# Altium schematic symbol library SCHLIB.SchLib: 2608 symbols (part 1 of 20)
Pins are listed as number, name and electrical type; pins without a type are passive.

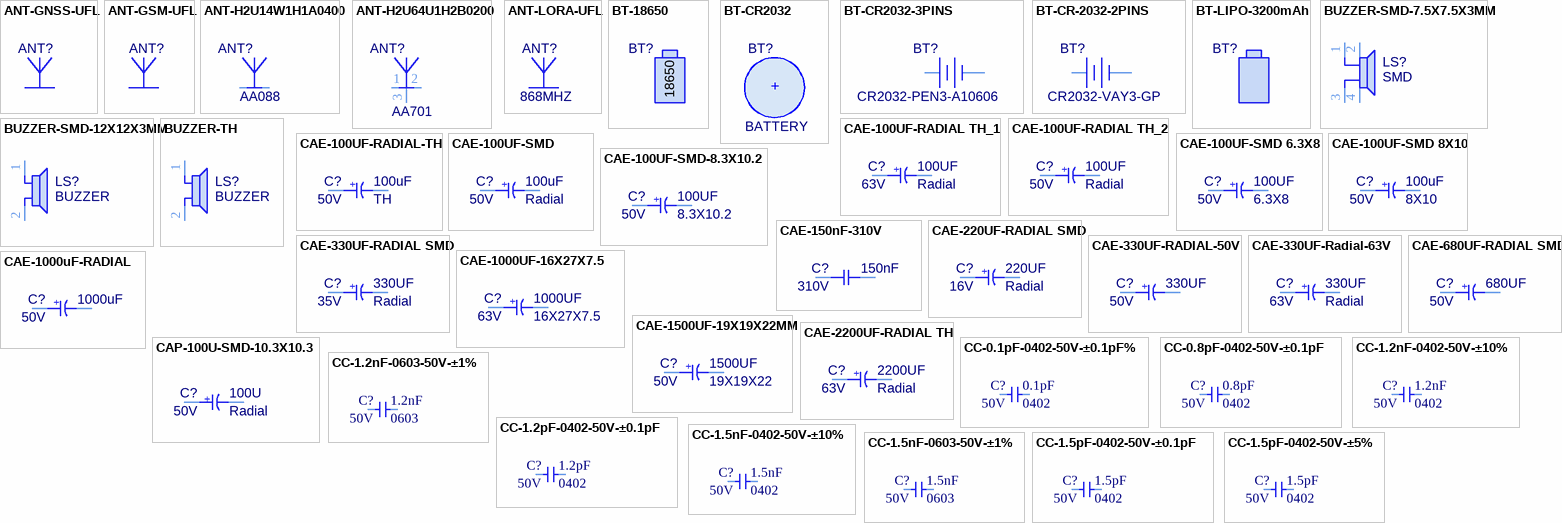
[diagram p0: symbols ANT-GNSS-UFL to CC-1.5pF-0402-50V-±5%]

## ANT-GNSS-UFL
designator ANT?, comment 206560-0050  (value not drawn)  (net tie)
RF ANT 1.561/1.575GHZ FLAT 50MM; Manufacturer: Molex; Number of Bands: 3; Return Loss: -8dB; Washability: OK; Supplier: Digi-Key; Manufacturer Part Number: 206560-0050; RoHS: No; Supplier Part Number: WM22046-ND; Stock: 0; Supplier 1: Digi-Key; Supplier Part Number 1: WM22046-ND; Pricing: 1=2.8, 10=2.517, 25=2.3744, 100=2.0229, 250=1.8994, 500=1.662, 1000=1.3771, 2500=1.2821, 5000=1.2346 (USD); Mount: Adhesive; Termination: Cable; ComponentLink1URL: https://www.molex.com/pdm_docs/sd/2065600100_sd.pdf?src-supplier=Digi-Key; ComponentLink1Description: https://www.molex.com/pdm_docs/sd/2065600100_sd.pdf?src-supplier=Digi-Key
footprint R-1206-ARRAY (SMD, 8-Leads, Body 1.6x3.2mm, Pitch 0.8mm)

## ANT-GSM-UFL
designator ANT?, comment ANT-GSMMQB-UFL  (value not drawn)  (net tie)
ANTENNA MINI GSM QUAD UF1 CONN; Manufacturer: RF Solutions; Number of Bands: 4; Gain: 1dB; Max Power Dissipation: 10W; Lead Length: 100mm; Washability: OK; Supplier: Digi-Key; Manufacturer Part Number: ANT-GSMMQB-UFL; Stock: 75; Pricing: 1=6,17000 (USD); RoHS: Yes; Mount: Adhesive; Termination: Connector; Package Quantity: 1; Height: 0.197inch; ComponentLink1URL: https://datasheet.ciiva.com/11768/0900766b80df9366-11768496.pdf?src-supplier=RSComponents; ComponentLink1Description: https://datasheet.ciiva.com/11768/0900766b80df9366-11768496.pdf?src-supplier=RSComponents; Supplier Part Number: ANT-GSMMQB-UFL-ND; Supplier 1: Digi-Key; Supplier Part Number 1: ANT-GSMMQB-UFL-ND

## ANT-H2U14W1H1A0400
designator ANT?, comment AA088
GNSS 1560-1606 MHZ WIDE BAND TEL; Manufacturer Part Number: H2U14W1H1A0400; Washability: OK; ComponentLink1Description: Datasheet; ComponentLink1URL: https://www.unictron.com/wp-content/uploads/Unictron_AA088_GNSS_Chip_Antenna_F-1.pdf
footprint ANT-GPS-2PIN (Chip Inductor, 2-Leads, Body 3.20x1.60mm, IPC Medium Density)
pins: 1 SIGNAL, 2

## ANT-H2U64U1H2B0200
designator ANT?, comment AA701
868MHZ ISM 863-870MHZ TELA CERAM; Manufacturer Part Number: H2U64U1H2B0200; Washability: OK; ComponentLink1Description: Datasheet; ComponentLink1URL: https://www.unictron.com/wp-content/uploads/Unictron_AA701_ISM_868MHz_Ceramic_Chip_Antenna_L.pdf
footprint ANT-LORA-3PINS (Chip Inductor, 2-Leads, Body 5.00x3.00mm, IPC Medium Density)
pins: 1 SIGNAL, 2 Tuning/Ground, 3 NC

## ANT-LORA-UFL
designator ANT?, comment 868MHZ  (net tie)
RF ANTENNA ISM 868-870MHZ; Manufacturer: Ethertronics; Manufacturer Part Number: 1001826; Number of Bands: 1; Washability: OK; Supplier: Digi-Key; Stock: 10571; Pricing: 1=6,50000, 100=4,75000, 1000=4,35000 (USD); RoHS: Yes; Mount: Surface Mount; Termination: Connector; Package Quantity: 1000; Packaging: Bulk; Height: 0.031inch; ComponentLink1URL: https://datasheet.ciiva.com/29647/1001826-may2013-29647348.pdf?src-supplier=Digi-Key; ComponentLink1Description: https://datasheet.ciiva.com/29647/1001826-may2013-29647348.pdf?src-supplier=Digi-Key; Supplier Part Number: 939-1044-ND; Supplier 1: Digi-Key; Supplier Part Number 1: 939-1044-ND

## BT-18650
designator BT?, comment 18650
BATTERY LITHIUM 3.7V 2.6AH; Manufacturer 1: SparkFun; Manufacturer Part Number 1: PRT-13189; Washability: OK; Supplier 1: Digi-Key; Supplier Part Number 1: 1568-1490-ND; RoHS: No; Stock 1: 340; Pricing 1: 1=6.50000 (USD); Voltage Rating: 3.7V; Capacity: 2.6ah; Termination: Solder; ComponentLink1URL: https://cdn.sparkfun.com/datasheets/Prototyping/ICR18650%202600mAH%20datasheet.pdf?src-supplier=Digi-Key; ComponentLink1Description: https://cdn.sparkfun.com/datasheets/Prototyping/ICR18650%202600mAH%20datasheet.pdf?src-supplier=Digi-Key

## BT-CR2032
designator BT?, comment BATTERY  (graphical)
BATTERY LITHIUM 3V COIN 20MM; Manufacturer: Panasonic BSG; Manufacturer Part Number: CR2032; Number of Cells: 1; Capacity: 225mAh; Washability: OK; Supplier 1: Digi-Key; Stock 1: 2819331; Pricing 1: 1=0.35000, 10=0.29000, 50=0.25560, 100=0.24110, 250=0.22444, 500=0.21220, 1000=0.20109, 2500=0.18665 (USD); RoHS: Yes; Mount: External; Weight: 0.1oz; Material: Lithium; Min Operating Temperature: -30°C; Max Operating Temperature: 60°C; Package Quantity: 200; Packaging: Tray; Voltage Rating (DC): 3V; Voltage: 3V; Chemistry/Technology: Lithium; Voltage Rating: 3V; Output Voltage: 3V; Diameter: 20mm; Height: 0.13inch; Radiation Hardening: No; Lead Free: Lead Free; ComponentLink1URL: https://datasheet.ciiva.com/2/crseries-datasheets-merged-2903.pdf?src-supplier=Digi-Key; ComponentLink1Description: https://datasheet.ciiva.com/2/crseries-datasheets-merged-2903.pdf?src-supplier=Digi-Key; ComponentLink2URL: https://datasheet.ciiva.com/12070/crseries-datasheets-merged-462862-12070381.pdf?src-supplier=Mouser; ComponentLink2Description: https://datasheet.ciiva.com/12070/crseries-datasheets-merged-462862-12070381.pdf?src-supplier=Mouser; ComponentLink3URL: https://datasheet.ciiva.com/2981/aaa4000ce51-2981326.pdf?src-supplier=Avnet; ComponentLink3Description: https://datasheet.ciiva.com/2981/aaa4000ce51-2981326.pdf?src-supplier=Avnet; ComponentLink4URL: https://datasheet.ciiva.com/16459/aaa4000ce51-16459422.pdf?src-supplier=Avnet+Asia; ComponentLink4Description: https://datasheet.ciiva.com/16459/aaa4000ce51-16459422.pdf?src-supplier=Avnet+Asia; Supplier Part Number 1: P189-ND
text: +

## BT-CR2032-3PINS
designator BT?, comment CR2032-PEN3-A10606
BATTERY LITHIUM 3V COIN 20MM; Manufacturer: Panasonic BSG; Manufacturer Part Number: ML-2020/G1AN; Capacity: 45mAh; Washability: OK; Supplier 1: Digi-Key; Stock 1: 6826; Pricing 1: 1=2.52000, 10=2.09100, 50=1.84400, 100=1.74100, 400=1.61743, 800=1.53500, 1200=1.45258, 2800=1.38047 (USD); RoHS: No; Mount: Through Hole; Number of Pins: 3; Weight: 2.2g; Min Operating Temperature: -20°C; Max Operating Temperature: 60°C; Package Quantity: 200; Termination: Solder; Chemistry/Technology: Lithium; Output Voltage: 3V; Voltage Rating: 3V; Voltage: 3V; Diameter: 20mm; Length: 20mm; Height: 2mm; Depth: 20mm; Lead Free: Lead Free; ComponentLink1URL: https://datasheet.ciiva.com/2/panasonic-lithium-cr2032-cr2330-2903.pdf?src-supplier=Digi-Key; ComponentLink1Description: https://datasheet.ciiva.com/2/panasonic-lithium-cr2032-cr2330-2903.pdf?src-supplier=Digi-Key; ComponentLink2URL: https://datasheet.ciiva.com/5303/ml-2020-g1an-181535-5303072.pdf?src-supplier=Mouser; ComponentLink2Description: https://datasheet.ciiva.com/5303/ml-2020-g1an-181535-5303072.pdf?src-supplier=Mouser; ComponentLink3URL: https://datasheet.ciiva.com/3773/ml2020g1an-3773244.pdf?src-supplier=Arrow; ComponentLink3Description: https://datasheet.ciiva.com/3773/ml2020g1an-3773244.pdf?src-supplier=Arrow; Supplier Part Number 1: P046-ND
footprint BT-CR2032-3 PINS
pins: 1 1,3, 2, 3

## BT-CR-2032-2PINS
designator BT?, comment CR2032-VAY3-GP
BATTERY LITHIUM 3V COIN 20MM; Manufacturer: Panasonic BSG; Manufacturer Part Number: CR-2032/HF1N; Capacity: 225mAh; Number of Cells: 1; Washability: OK; Supplier 1: Digi-Key; Stock 1: 17680; Pricing 1: 1=1.17000, 10=0.97300, 50=0.85560, 100=0.80780, 250=0.75132, 500=0.71226, 1000=0.67317, 2500=0.62539 (USD); RoHS: Yes; Mount: Through Hole; Min Operating Temperature: -30°C; Max Operating Temperature: 60°C; Package Quantity: 360; Chemistry/Technology: Lithium; Voltage Rating: 3V; Output Voltage: 3V; Packaging: Bulk; Termination: Through Hole; Voltage: 3V; Orientation: Horizontal; Diameter: 20mm; Height: 3.2mm; Radiation Hardening: No; Lead Free: Lead Free; ComponentLink1URL: https://datasheet.ciiva.com/26941/getdatasheetpartid-792005-26941171.pdf?src-supplier=Verical; ComponentLink1Description: https://datasheet.ciiva.com/26941/getdatasheetpartid-792005-26941171.pdf?src-supplier=Verical; ComponentLink2URL: https://datasheet.ciiva.com/24073/aad4000de237-259049-24073612.pdf?src-supplier=Mouser; ComponentLink2Description: https://datasheet.ciiva.com/24073/aad4000de237-259049-24073612.pdf?src-supplier=Mouser; ComponentLink3URL: https://datasheet.ciiva.com/3/aaa4000de87-3074.pdf?src-supplier=Digi-Key; ComponentLink3Description: https://datasheet.ciiva.com/3/aaa4000de87-3074.pdf?src-supplier=Digi-Key; Supplier Part Number 1: P658-ND
footprint BT-CR2032-2PINS
pins: 1, 2

## BT-LIPO-3200mAh
designator BT?, comment PX6047103  (value not drawn)
Li-Polymer Battery 3.7V 3200 mAh; Manufacturer: Power-Xtra; Capacity: 3.2ah; Washability: OK; Manufacturer Part Number: PX6047103; RoHS: No; Voltage Rating: 3.7V; Termination: Solder

## BUZZER-SMD-7.5X7.5X3MM
designator LS?  Case/Package: SMD  (hidden comment: *)
BUZZER MAGNETIC 3.6V 7.5X7.5 SMD; Manufacturer: Mallory Sonalert; Manufacturer Part Number: AST7525MATRQ; Frequency: 2.7kHz; Current Rating: 100mA; Min Supply Voltage: 2.5V; Max Supply Voltage: 4.5V; Washability: OK; Supplier 1: Digi-Key; Stock 1: 16208; Pricing 1: 1=2.66, 10=2.114, 25=1.9236, 50=1.8006, 100=1.6776, 250=1.53216, 500=1.42032 (USD); Mount: Surface Mount; Color: Black; Min Operating Temperature: -30°C; Max Operating Temperature: 70°C; Packaging: Tape and Reel; Self Resonant Frequency: 2.7kHz; Voltage Rating: 3.6V; Operating Supply Current: 100mA; Termination: Solder; Sensing Method: Magnetic; Length: 7.5mm; Height: 2.5mm; Width: 7.5mm; REACH SVHC: Unknown; ComponentLink1URL: http://www.mallory-sonalert.com/specifications/AST7525MATRQ.pdf; ComponentLink1Description: http://www.mallory-sonalert.com/specifications/AST7525MATRQ.pdf; ComponentLink2URL: http://www.farnell.com/datasheets/1916625.pdf; ComponentLink2Description: http://www.farnell.com/datasheets/1916625.pdf; ComponentLink3URL: http://www.mouser.com/ds/2/252/AST7525MATRQ-48037.pdf; ComponentLink3Description: http://www.mouser.com/ds/2/252/AST7525MATRQ-48037.pdf; ComponentLink4URL: https://www.mspindy.com/specifications/AST7525MATRQ.pdf; ComponentLink4Description: https://www.mspindy.com/specifications/AST7525MATRQ.pdf; Supplier Part Number 1: 458-1100-6-ND
footprint BUZZER-SMD
pins: 1, 2, 3, 4

## BUZZER-SMD-12X12X3MM
designator LS?, comment BUZZER
Washability: OK
footprint BUZZER-SMD-12X12X3MM
pins: 1, 2

## BUZZER-TH
designator LS?, comment BUZZER
AUDIO MAGNETIC XDCR 4-6V TH; Manufacturer: Soberton; Manufacturer Part Number: WST-1205S; Frequency: 2.3kHz; Voltage Rating: 5V; Operating Supply Current: 30mA; Washability: OK; Supplier 1: Digi-Key; Stock 1: 85503; Pricing 1: 1=1.41, 10=1.117, 25=1.0176, 50=0.9516, 100=0.8855, 250=0.80852, 500=0.7535, 1000=0.704, 5000=0.6875 (USD); Mount: Through Hole; Min Operating Temperature: -20°C; Max Operating Temperature: 60°C; Packaging: Bulk; Termination: PC Pins; Sensing Method: Magnetic; Self Resonant Frequency: 2.3kHz; Diameter: 12mm; Height: 9.5mm; Lead Free: Contains Lead; ComponentLink1URL: http://cirlw3yrzg4afc1x47lv2k18.wpengine.netdna-cdn.com/wp-content/uploads/2016/12/WST-1205S-new.pdf; ComponentLink1Description: http://cirlw3yrzg4afc1x47lv2k18.wpengine.netdna-cdn.com/wp-content/uploads/2016/12/WST-1205S-new.pdf; Supplier Part Number 1: 433-1029-ND
footprint BUZZER-7.62MM-TH
pins: 1, 2

## CAE-100UF-RADIAL TH_1
designator C?, comment 100UF  Voltage Rating: 63V  Case/Package: Radial
CAP ALUM 100UF 63V 20% RADIAL; Manufacturer: Nichicon; Manufacturer Part Number: UVR1J101MPD; Dielectric Material: Aluminium; Ripple Current: 300mA; Leakage Current: 189uA; Life (Hours): 2000Hour; Dissipation Factor: 0.1%; Lead Diameter: 0.6mm; ESR (Equivalent Series Resistance): 460mR; Impedance: 256mR; Polarity: Polar; Lead/Base Style: Straight; Washability: OK; Supplier 1: Digi-Key; Supplier Part Number 1: 493-1124-ND; Stock 1: 22422; Pricing 1: 1=0.38, 10=0.264, 100=0.1581, 500=0.1186, 1000=0.10015, 2500=0.09488, 5000=0.08961 (USD); Mount: PCB,Through Hole; Number of Pins: 2; Min Operating Temperature: -40°C; Max Operating Temperature: 85°C; Capacitance: 100uF; Tolerance: 20%; Package Quantity: 200; Packaging: Bulk; Voltage Rating (DC): 63V; Termination: Radial; Voltage: 63V; Features: General Purpose; Diameter: 10mm; Length: 12.5mm; Height: 12.5mm; Lead Pitch: 5mm; Height - Seated (Max): 0.394inch; Radiation Hardening: No; REACH SVHC: No SVHC; Lead Free: Lead Free; ComponentLink1URL: https://www.verical.com/server-webapp/html/getDatasheet?partID=54724; ComponentLink1Description: https://www.verical.com/server-webapp/html/getDatasheet?partID=54724; ComponentLink2URL: http://www.nichicon.co.jp/english/products/pdfs/e-vr.pdf; ComponentLink2Description: http://www.nichicon.co.jp/english/products/pdfs/e-vr.pdf; ComponentLink3URL: http://nichicon-us.com/english/products/pdfs/e-mi_tape.pdf; ComponentLink3Description: http://nichicon-us.com/english/products/pdfs/e-mi_tape.pdf; ComponentLink4URL: http://products.nichicon.co.jp/en/pdf/XJA043/e-vr.pdf; ComponentLink4Description: http://products.nichicon.co.jp/en/pdf/XJA043/e-vr.pdf; ComponentLink5URL: http://www.alliedelec.com/m/d/2079ee50b23aa24d1fe62a3e164465c7.pdf; ComponentLink5Description: http://www.alliedelec.com/m/d/2079ee50b23aa24d1fe62a3e164465c7.pdf; ComponentLink6URL: http://www.mouser.com/ds/2/293/e-uvz-880014.pdf; ComponentLink6Description: http://www.mouser.com/ds/2/293/e-uvz-880014.pdf; ComponentLink7URL: http://www.nichicon.co.jp/english/products/pdfs/e-vz.pdf; ComponentLink7Description: http://www.nichicon.co.jp/english/products/pdfs/e-vz.pdf; ComponentLink8URL: http://www.alliedelec.com/m/d/825fa8fc1ff7f2c7f22f565ab2398abe.pdf; ComponentLink8Description: http://www.alliedelec.com/m/d/825fa8fc1ff7f2c7f22f565ab2398abe.pdf; ComponentLink9URL: http://nichicon-us.com/english/products/pdfs/e-uvz.pdf; ComponentLink9Description: http://nichicon-us.com/english/products/pdfs/e-uvz.pdf; Supplier 2: Digi-Key; Supplier Part Number 2: 493-1936-ND; Stock 2: 17120; Pricing 2: 1=0.45, 10=0.317, 100=0.2085, 500=0.15442, 1000=0.13125, 2500=0.12353, 5000=0.11581 (USD); ComponentLink10URL: http://www.mouser.com/ds/2/293/e-upw-883815.pdf; ComponentLink10Description: http://www.mouser.com/ds/2/293/e-upw-883815.pdf; ComponentLink11URL: http://www.nichicon.co.jp/english/products/pdfs/e-pw.pdf; ComponentLink11Description: http://www.nichicon.co.jp/english/products/pdfs/e-pw.pdf; ComponentLink12URL: http://uk.rs-online.com/webdocs/0ec9/0900766b80ec9186.pdf; ComponentLink12Description: http://uk.rs-online.com/webdocs/0ec9/0900766b80ec9186.pdf; ComponentLink13URL: http://www.alliedelec.com/m/d/6537666b9e71158eceac60ee1d77586f.pdf; ComponentLink13Description: http://www.alliedelec.com/m/d/6537666b9e71158eceac60ee1d77586f.pdf; ComponentLink14URL: https://www.verical.com/server-webapp/html/getDatasheet?partID=497226; ComponentLink14Description: https://www.verical.com/server-webapp/html/getDatasheet?partID=497226; ComponentLink15URL: http://www.produktinfo.conrad.com/datenblaetter/425000-449999/444542-da-01-en-RADIAL_ELKO_PW_100UF_63_V.pdf; ComponentLink15Description: http://www.produktinfo.conrad.com/datenblaetter/425000-449999/444542-da-01-en-RADIAL_ELKO_PW_100UF_63_V.pdf; Supplier 3: Digi-Key; Supplier Part Number 3: 718-2234-ND; Stock 3: 580; Pricing 3: 1=0.76, 10=0.538, 100=0.3544, 500=0.2625, 1000=0.22313, 2500=0.21, 5000=0.19688 (USD); ComponentLink16URL: http://www.farnell.com/datasheets/716566.pdf; ComponentLink16Description: http://www.farnell.com/datasheets/716566.pdf
pins: 1, 2
text: +

## CAE-100UF-RADIAL TH_2
designator C?, comment 100UF  Voltage Rating: 50V  Case/Package: Radial
CAP ALUM 100UF 20% 50V RADIAL; Manufacturer: Panasonic; Manufacturer Part Number: EEU-FM1H101B; Ripple Current: 870mA; Impedance: 61mR; Life (Hours): 3000Hour; Polarity: Polar; Dissipation Factor: 0.1%; Lead/Base Style: Straight; Lead Diameter: 0.6mm; Dielectric Material: Aluminium; Leakage Current: 150uA; Washability: OK; Supplier 1: Digi-Key; Supplier Part Number 1: P19712CT-ND; Stock 1: 7813; Pricing 1: 1=0.51, 10=0.356, 100=0.2137, 500=0.1603 (USD); Mount: PCB,Through Hole; Min Operating Temperature: -40°C; Max Operating Temperature: 105°C; Capacitance: 100uF; Tolerance: 20%; Packaging: Tape and Reel; Package Quantity: 1000; Voltage Rating (DC): 50V; ESR (Equivalent Series Resistance): 61mR; Termination: Radial; Diameter: 8mm; Length: 11.5mm; Height: 11.5mm; Lead Pitch: 5mm; Height - Seated (Max): 0.512inch; Radiation Hardening: No; REACH SVHC: No SVHC; Lead Free: Lead Free; ComponentLink1URL: https://www.alliedelec.com/m/d/fdd897f5b67d9afc9e8599215884f1a0.pdf; ComponentLink1Description: https://www.alliedelec.com/m/d/fdd897f5b67d9afc9e8599215884f1a0.pdf; ComponentLink2URL: http://www.farnell.com/datasheets/1971458.pdf; ComponentLink2Description: http://www.farnell.com/datasheets/1971458.pdf; ComponentLink3URL: http://www.farnell.com/datasheets/1678946.pdf; ComponentLink3Description: http://www.farnell.com/datasheets/1678946.pdf; ComponentLink4URL: http://industrial.panasonic.com/www-data/pdf/ABA0000/ABA0000CE108.pdf; ComponentLink4Description: http://industrial.panasonic.com/www-data/pdf/ABA0000/ABA0000CE108.pdf; Supplier 2: Digi-Key; Supplier Part Number 2: P19713TB-ND; Stock 2: 1000; Pricing 2: 1000=0.11771, 2000=0.11151, 5000=0.10532, 10000=0.09912, 25000=0.09293, 50000=0.08673, 100000=0.08054 (USD); Features: General Purpose; Supplier 3: Digi-Key; Supplier Part Number 3: 493-13464-1-ND; Stock 3: 54331; Pricing 3: 1=0.36, 10=0.251, 100=0.1507, 500=0.11302 (USD); Number of Pins: 2; ComponentLink5URL: http://nichicon-us.com/english/products/pdfs/e-mi_tape.pdf; ComponentLink5Description: http://nichicon-us.com/english/products/pdfs/e-mi_tape.pdf; ComponentLink6URL: http://www.alliedelec.com/m/d/825fa8fc1ff7f2c7f22f565ab2398abe.pdf; ComponentLink6Description: http://www.alliedelec.com/m/d/825fa8fc1ff7f2c7f22f565ab2398abe.pdf; ComponentLink7URL: http://www.farnell.com/datasheets/1909357.pdf; ComponentLink7Description: http://www.farnell.com/datasheets/1909357.pdf; ComponentLink8URL: http://nichicon-us.com/english/products/pdfs/e-vz.pdf; ComponentLink8Description: http://nichicon-us.com/english/products/pdfs/e-vz.pdf; Voltage: 50V
footprint THT_8x13x3.5
pins: 1, 2
text: +

## CAE-100UF-RADIAL-TH
designator C?, comment Voltage Rating (DC): 50V  Mount: TH  (hidden comment: 100UF)
CAP ALUM 100UF 20% 50V RADIAL; Manufacturer: Nichicon; Manufacturer Part Number: UVR1H101MPD1TA; Dielectric Material: Aluminium; Ripple Current: 260mA; Leakage Current: 150uA; Life (Hours): 2000Hour; Dissipation Factor: 0.12%; Lead Diameter: 0.6mm; Washability: OK; Supplier 1: Digi-Key; Stock 1: 12000; Pricing 1: 1000=0.07519, 2000=0.07161, 5000=0.06624, 10000=0.06266, 25000=0.05729, 50000=0.05371, 100000=0.04744 (USD); Case/Package: Radial; Number of Pins: 2; Min Operating Temperature: -40°C; Max Operating Temperature: 85°C; Package Quantity: 1000; Voltage Rating: 50V; Tolerance: 20%; Packaging: Tape and Reel; Termination: Radial; Diameter: 8mm; Length: 11.5mm; Height: 11.5mm; Lead Pitch: 5mm; Height - Seated (Max): 0.453inch; Radiation Hardening: No; REACH SVHC: No SVHC; Lead Free: Lead Free; ComponentLink1URL: http://nichicon-us.com/english/products/pdfs/e-mi_tape.pdf; ComponentLink1Description: http://nichicon-us.com/english/products/pdfs/e-mi_tape.pdf; ComponentLink2URL: https://www.verical.com/server-webapp/html/getDatasheet?partID=54730; ComponentLink2Description: https://www.verical.com/server-webapp/html/getDatasheet?partID=54730; ComponentLink3URL: http://products.nichicon.co.jp/en/pdf/XJA043/e-vr.pdf; ComponentLink3Description: http://products.nichicon.co.jp/en/pdf/XJA043/e-vr.pdf; Supplier Part Number 1: UVR1H101MPD1TA-ND; Supplier 2: Digi-Key; Supplier Part Number 2: 515D107M050BB6AE3-ND; Capacitance: 100uF
footprint C-RADİAL-8X11.5X5
pins: 1, 2
text: +

## CAE-100UF-SMD
designator C?, comment Case/Package: Radial  Voltage Rating (DC): 50V  (hidden comment: 100UF)
CAP ALUM 100UF 20% 50V SMD; Manufacturer: Nichicon; Manufacturer Part Number: UUD1H101MNL1GS; Dielectric Material: Aluminium; Ripple Current: 300mA; Life (Hours): 5000Hour; Impedance: 340mR; Leakage Current: 3uA; Dissipation Factor: 0.14%; Lead Diameter: 1.1mm; Washability: OK; Supplier 1: Digi-Key; Stock 1: 72155; Pricing 1: 1=0.75, 10=0.554, 100=0.3796 (USD); Number of Pins: 2; Min Operating Temperature: -55°C; Max Operating Temperature: 105°C; Tolerance: 20%; Ripple Current (AC): 300mA; Package Quantity: 500; Packaging: Tape and Reel; Voltage Rating: 50V; Termination: SMD/SMT; Voltage: 50V; Diameter: 8mm; Length: 10mm; Height: 10mm; Lead Pitch: 3.1mm; Height - Seated (Max): 0.394inch; Radiation Hardening: No; REACH SVHC: No SVHC; Lead Free: Lead Free; ComponentLink1URL: http://www.farnell.com/datasheets/2100017.pdf; ComponentLink1Description: http://www.farnell.com/datasheets/2100017.pdf; ComponentLink2URL: http://nichicon-us.com/english/products/pdfs/e-uud.pdf; ComponentLink2Description: http://nichicon-us.com/english/products/pdfs/e-uud.pdf; ComponentLink3URL: http://www.nichicon.co.jp/english/products/pdfs/e-ch_ref.pdf; ComponentLink3Description: http://www.nichicon.co.jp/english/products/pdfs/e-ch_ref.pdf; ComponentLink4URL: http://nichicon-us.com/english/products/pdfs/e-ud.pdf; ComponentLink4Description: http://nichicon-us.com/english/products/pdfs/e-ud.pdf; ComponentLink5URL: http://www.farnell.com/datasheets/1910936.pdf; ComponentLink5Description: http://www.farnell.com/datasheets/1910936.pdf; ComponentLink6URL: http://www.farnell.com/datasheets/66055.pdf; ComponentLink6Description: http://www.farnell.com/datasheets/66055.pdf; ComponentLink7URL: http://uk.rs-online.com/webdocs/0fa3/0900766b80fa39e7.pdf; ComponentLink7Description: http://uk.rs-online.com/webdocs/0fa3/0900766b80fa39e7.pdf; ComponentLink8URL: http://www.nichicon.co.jp/english/products/pdfs/e-ud.pdf; ComponentLink8Description: http://www.nichicon.co.jp/english/products/pdfs/e-ud.pdf; Supplier Part Number 1: 493-2306-6-ND; Supplier 2: Digi-Key; Supplier Part Number 2: 565-2495-6-ND; Capacitance: 100uF
pins: 1, 2
text: +

## CAE-100UF-SMD 6.3X8
designator C?, comment 100UF  Case/Package: 6.3X8  Voltage Rating: 50V
CAP ALUM 100UF 20% 50V SMD; Manufacturer: Panasonic; Manufacturer Part Number: EEE-FTH101XAP; Ripple Current (AC): 350mA; ESR (Equivalent Series Resistance): 340mR; Life (Hours): 2000Hour; Leakage Current: 50uA; Lead Diameter: 0.65mm; Dielectric Material: Aluminium; Dissipation Factor: 0.14%; Polarity: Polar; Washability: OK; Supplier 1: Digi-Key; Supplier Part Number 1: PCE5024DKR-ND; Stock 1: 119228; Pricing 1: 1=0.8, 10=0.591, 100=0.4051 (USD); Mount: PCB,Surface Mount; Number of Pins: 2; Contact Plating: Tin; Min Operating Temperature: -55°C; Max Operating Temperature: 105°C; Packaging: Tape and Reel; Capacitance: 100uF; Tolerance: 20%; Ripple Current: 350mA; Package Quantity: 1; Voltage Rating (DC): 50V; Termination: SMD/SMT; Voltage: 50V; Diameter: 6.3mm; Length: 7.7mm; Height: 7.7mm; Lead Pitch: 1.8mm; Height - Seated (Max): 0.315inch; Radiation Hardening: No; REACH SVHC: No SVHC; ComponentLink1URL: http://uk.rs-online.com/webdocs/0f49/0900766b80f4973e.pdf; ComponentLink1Description: http://uk.rs-online.com/webdocs/0f49/0900766b80f4973e.pdf; ComponentLink2URL: https://www.distrelec.biz/Web/Downloads/_t/ds/smd_ft_eng_tds.pdf?mime=application%2Fpdf; ComponentLink2Description: https://www.distrelec.biz/Web/Downloads/_t/ds/smd_ft_eng_tds.pdf?mime=application%2Fpdf; ComponentLink3URL: http://www.farnell.com/datasheets/1244238.pdf; ComponentLink3Description: http://www.farnell.com/datasheets/1244238.pdf; ComponentLink4URL: http://www.farnell.com/datasheets/1898066.pdf; ComponentLink4Description: http://www.farnell.com/datasheets/1898066.pdf; ComponentLink5URL: http://www.farnell.com/datasheets/1790597.pdf; ComponentLink5Description: http://www.farnell.com/datasheets/1790597.pdf; ComponentLink6URL: http://www.mouser.com/ds/2/315/ABA0000C573-947481.pdf; ComponentLink6Description: http://www.mouser.com/ds/2/315/ABA0000C573-947481.pdf; ComponentLink7URL: http://industrial.panasonic.com/www-data/pdf/ABA0000/ABA0000CE135.pdf; ComponentLink7Description: http://industrial.panasonic.com/www-data/pdf/ABA0000/ABA0000CE135.pdf; Impedance: 340mR; Lead Free: Lead Free; ComponentLink8URL: http://www.farnell.com/datasheets/2100017.pdf; ComponentLink8Description: http://www.farnell.com/datasheets/2100017.pdf; ComponentLink9URL: http://nichicon-us.com/english/products/pdfs/e-uud.pdf; ComponentLink9Description: http://nichicon-us.com/english/products/pdfs/e-uud.pdf; ComponentLink10URL: http://www.nichicon.co.jp/english/products/pdfs/e-ch_ref.pdf; ComponentLink10Description: http://www.nichicon.co.jp/english/products/pdfs/e-ch_ref.pdf; ComponentLink11URL: http://nichicon-us.com/english/products/pdfs/e-ud.pdf; ComponentLink11Description: http://nichicon-us.com/english/products/pdfs/e-ud.pdf; ComponentLink12URL: http://www.farnell.com/datasheets/1910936.pdf; ComponentLink12Description: http://www.farnell.com/datasheets/1910936.pdf; ComponentLink13URL: http://www.farnell.com/datasheets/66055.pdf; ComponentLink13Description: http://www.farnell.com/datasheets/66055.pdf; ComponentLink14URL: http://uk.rs-online.com/webdocs/0fa3/0900766b80fa39e7.pdf; ComponentLink14Description: http://uk.rs-online.com/webdocs/0fa3/0900766b80fa39e7.pdf; ComponentLink15URL: http://www.nichicon.co.jp/english/products/pdfs/e-ud.pdf; ComponentLink15Description: http://www.nichicon.co.jp/english/products/pdfs/e-ud.pdf; Supplier 2: Digi-Key; Supplier Part Number 2: 565-4324-6-ND; Stock 2: 3225; Pricing 2: 1=0.81, 10=0.599, 100=0.4108 (USD)
footprint C-E-6.6x6.6x8 (Aluminum Electrolytic Capacitor, Body 6,60x6,60x8,00mm, IPC Low Density)
pins: 1, 2
text: +

## CAE-100UF-SMD 8X10
designator C?, comment Case/Package: 8X10  Voltage Rating (DC): 50V  (hidden comment: 100UF)
CAP ALUM 100UF 20% 50V SMD; Manufacturer: Nichicon; Manufacturer Part Number: UUD1H101MNL1GS; Dielectric Material: Aluminium; Ripple Current: 300mA; Life (Hours): 5000Hour; Impedance: 340mR; Leakage Current: 3uA; Dissipation Factor: 0.14%; Lead Diameter: 1.1mm; Washability: OK; Supplier 1: Digi-Key; Stock 1: 72155; Pricing 1: 1=0.75, 10=0.554, 100=0.3796 (USD); Number of Pins: 2; Min Operating Temperature: -55°C; Max Operating Temperature: 105°C; Tolerance: 20%; Ripple Current (AC): 300mA; Package Quantity: 500; Packaging: Tape and Reel; Voltage Rating: 50V; Termination: SMD/SMT; Voltage: 50V; Diameter: 8mm; Length: 10mm; Height: 10mm; Lead Pitch: 3.1mm; Height - Seated (Max): 0.394inch; Radiation Hardening: No; REACH SVHC: No SVHC; Lead Free: Lead Free; ComponentLink1URL: http://www.farnell.com/datasheets/2100017.pdf; ComponentLink1Description: http://www.farnell.com/datasheets/2100017.pdf; ComponentLink2URL: http://nichicon-us.com/english/products/pdfs/e-uud.pdf; ComponentLink2Description: http://nichicon-us.com/english/products/pdfs/e-uud.pdf; ComponentLink3URL: http://www.nichicon.co.jp/english/products/pdfs/e-ch_ref.pdf; ComponentLink3Description: http://www.nichicon.co.jp/english/products/pdfs/e-ch_ref.pdf; ComponentLink4URL: http://nichicon-us.com/english/products/pdfs/e-ud.pdf; ComponentLink4Description: http://nichicon-us.com/english/products/pdfs/e-ud.pdf; ComponentLink5URL: http://www.farnell.com/datasheets/1910936.pdf; ComponentLink5Description: http://www.farnell.com/datasheets/1910936.pdf; ComponentLink6URL: http://www.farnell.com/datasheets/66055.pdf; ComponentLink6Description: http://www.farnell.com/datasheets/66055.pdf; ComponentLink7URL: http://uk.rs-online.com/webdocs/0fa3/0900766b80fa39e7.pdf; ComponentLink7Description: http://uk.rs-online.com/webdocs/0fa3/0900766b80fa39e7.pdf; ComponentLink8URL: http://www.nichicon.co.jp/english/products/pdfs/e-ud.pdf; ComponentLink8Description: http://www.nichicon.co.jp/english/products/pdfs/e-ud.pdf; Supplier Part Number 1: 493-2306-6-ND; Supplier 2: Digi-Key; Supplier Part Number 2: 565-2495-6-ND; Capacitance: 100uF
pins: 1, 2
text: +

## CAE-100UF-SMD-8.3X10.2
designator C?, comment 100UF  Voltage Rating: 50V  Case/Package: 8.3X10.2
CAP ALUM 100UF 20% 50V SMD; Manufacturer: Panasonic; Manufacturer Part Number: EEE1HA101UP; Ripple Current: 200mA; Life (Hours): 2000Hour; Dielectric Material: Aluminium; Impedance: 340mR; Leakage Current: 3uA; Dissipation Factor: 0.14%; Lead Diameter: 1.1mm; Washability: OK; Supplier 1: Digi-Key; Supplier Part Number 1: PCE3917DKR-ND; Stock 1: 353681; Pricing 1: 1=0.64, 10=0.454, 100=0.2987 (USD); Mount: PCB,Surface Mount; Contact Plating: Tin; Min Operating Temperature: -40°C; Max Operating Temperature: 85°C; Capacitance: 100uF; Tolerance: 20%; Ripple Current (AC): 200mA; Packaging: Tape and Reel; Voltage Rating (DC): 50V; Package Quantity: 1; Termination: SMD/SMT; Diameter: 8mm; Length: 10.5mm; Height: 10.2mm; Height - Seated (Max): 0.402inch; Radiation Hardening: No; REACH SVHC: Unknown; Lead Free: Lead Free; ComponentLink1URL: http://industrial.panasonic.com/www-data/pdf/ABA0000/ABA0000CE2.pdf?src-supplier=Avnet; ComponentLink1Description: http://industrial.panasonic.com/www-data/pdf/ABA0000/ABA0000CE2.pdf?src-supplier=Avnet; ComponentLink2URL: http://www.jameco.com/Jameco/Products/ProdDS/1356308.pdf?src-supplier=Jameco; ComponentLink2Description: http://www.jameco.com/Jameco/Products/ProdDS/1356308.pdf?src-supplier=Jameco; ComponentLink3URL: https://www.verical.com/server-webapp/html/getDatasheet?partID=111566&src-supplier=Verical; ComponentLink3Description: https://www.verical.com/server-webapp/html/getDatasheet?partID=111566&src-supplier=Verical; ComponentLink4URL: http://industrial.panasonic.com/www-data/pdf/ABA0000/ABA0000CE2.pdf?src-supplier=Avnet+Europe; ComponentLink4Description: http://industrial.panasonic.com/www-data/pdf/ABA0000/ABA0000CE2.pdf?src-supplier=Avnet+Europe; ComponentLink5URL: https://www.alliedelec.com/m/d/310b2cfd0553a89b5ffae819c6e32d0a.pdf?src-supplier=Allied+Electronics; ComponentLink5Description: https://www.alliedelec.com/m/d/310b2cfd0553a89b5ffae819c6e32d0a.pdf?src-supplier=Allied+Electronics; ComponentLink6URL: http://industrial.panasonic.com/www-data/pdf/ABA0000/ABA0000CE2.pdf?src-supplier=Future+Electronics; ComponentLink6Description: http://industrial.panasonic.com/www-data/pdf/ABA0000/ABA0000CE2.pdf?src-supplier=Future+Electronics; ComponentLink7URL: http://www.mouser.com/ds/2/315/ABA0000CE2-40801.pdf?src-supplier=Mouser; ComponentLink7Description: http://www.mouser.com/ds/2/315/ABA0000CE2-40801.pdf?src-supplier=Mouser; Supplier 2: Digi-Key; Supplier Part Number 2: 493-2306-6-ND; Stock 2: 69145; Pricing 2: 1=0.72, 10=0.527, 100=0.3616 (USD); Number of Pins: 2; Voltage: 50V; Lead Pitch: 3.1mm; ComponentLink8URL: http://www.farnell.com/datasheets/2100017.pdf?src-supplier=Farnell; ComponentLink8Description: http://www.farnell.com/datasheets/2100017.pdf?src-supplier=Farnell; ComponentLink9URL: http://nichicon-us.com/english/products/pdfs/e-uud.pdf?src-supplier=Digi-Key; ComponentLink9Description: http://nichicon-us.com/english/products/pdfs/e-uud.pdf?src-supplier=Digi-Key; ComponentLink10URL: http://www.nichicon.co.jp/english/products/pdfs/e-ch_ref.pdf?src-supplier=Digi-Key; ComponentLink10Description: http://www.nichicon.co.jp/english/products/pdfs/e-ch_ref.pdf?src-supplier=Digi-Key; ComponentLink11URL: http://nichicon-us.com/english/products/pdfs/e-ud.pdf?src-supplier=Element14; ComponentLink11Description: http://nichicon-us.com/english/products/pdfs/e-ud.pdf?src-supplier=Element14; ComponentLink12URL: http://www.farnell.com/datasheets/1910936.pdf?src-supplier=Element14; ComponentLink12Description: http://www.farnell.com/datasheets/1910936.pdf?src-supplier=Element14; ComponentLink13URL: http://nichicon-us.com/english/products/pdfs/e-ud.pdf?src-supplier=Mouser; ComponentLink13Description: http://nichicon-us.com/english/products/pdfs/e-ud.pdf?src-supplier=Mouser; ComponentLink14URL: http://www.farnell.com/datasheets/66055.pdf?src-supplier=Element14; ComponentLink14Description: http://www.farnell.com/datasheets/66055.pdf?src-supplier=Element14; ComponentLink15URL: http://uk.rs-online.com/webdocs/0fa3/0900766b80fa39e7.pdf?src-supplier=RSComponents; ComponentLink15Description: http://uk.rs-online.com/webdocs/0fa3/0900766b80fa39e7.pdf?src-supplier=RSComponents; ComponentLink16URL: http://www.nichicon.co.jp/english/products/pdfs/e-ud.pdf?src-supplier=Avnet+Europe; ComponentLink16Description: http://www.nichicon.co.jp/english/products/pdfs/e-ud.pdf?src-supplier=Avnet+Europe
footprint C-E-8.3x8.3x10.2
pins: 1, 2
text: +

## CAE-150nF-310V
designator C?, comment 150nF  Voltage Rating (AC): 310V
CAP FILM 0.15UF 10% 310VAC RAD; Manufacturer: Wurth Electronics; Manufacturer Part Number: 890334023025CS; Dielectric Material: PP; Supplier 1: Digi-Key; Supplier Part Number 1: 732-5735-ND; Stock: 1715; Pricing: 1=0.45, 50=0.345, 100=0.308, 250=0.283, 500=0.246, 1000=0.228 (USD); RoHS: Yes; Mount: Through Hole; Case/Package: Radial; Min Operating Temperature: -40°C; Max Operating Temperature: 105°C; Packaging: Bulk; Dielectric: PP; Termination: PC Pins; Capacitance: 150nF; Tolerance: 10%; Length: 0.512inch; Width: 0.276inch; Height - Seated (Max): 0.492inch; Lead Pitch: 0.394inch; REACH SVHC: Unknown; ComponentLink1URL: http://www.farnell.com/datasheets/1854425.pdf?src-supplier=Farnell; ComponentLink1Description: http://www.farnell.com/datasheets/1854425.pdf?src-supplier=Farnell; ComponentLink2URL: http://www.farnell.com/datasheets/1854425.pdf?src-supplier=Element14; ComponentLink2Description: http://www.farnell.com/datasheets/1854425.pdf?src-supplier=Element14
footprint C-FTXX_L13W7H12 (Film Capacitors, 13x7x12mm)
pins: 1, 2

## CAE-220UF-RADIAL SMD
designator C?, comment 220UF  Case/Package: Radial  Voltage Rating: 16V
CAP ALUM 220UF 20% 16V SMD; Manufacturer: Panasonic; Manufacturer Part Number: EEE-1CA221UP; Ripple Current (AC): 280mA; Life (Hours): 2000Hour; Leakage Current: 3uA; Dielectric Material: Aluminium; Impedance: 180mR; Dissipation Factor: 0.16%; Washability: OK; Stock 1: 69049; Pricing 1: 1=0.48, 10=0.339, 100=0.223, 500=0.16518 (USD); Mount: PCB,Surface Mount; Min Operating Temperature: -40°C; Max Operating Temperature: 85°C; Capacitance: 220uF; Tolerance: 20%; Packaging: Tape and Reel; Package Quantity: 1; Voltage Rating (DC): 16V; Termination: SMD/SMT; Voltage: 16V; Ripple Current: 280mA; Diameter: 6.3mm; Length: 6.5mm; Height: 10.2mm; Height - Seated (Max): 0.244inch; REACH SVHC: Unknown; Lead Free: Lead Free; ComponentLink1URL: http://www.farnell.com/datasheets/1800489.pdf; ComponentLink1Description: http://www.farnell.com/datasheets/1800489.pdf; ComponentLink2URL: http://components.arrow.com/part/dataview/41790773S9646858N1386; ComponentLink2Description: http://components.arrow.com/part/dataview/41790773S9646858N1386; Stock 2: 2294; Pricing 2: 1=0.75, 10=0.531, 100=0.3495, 500=0.25888 (USD); Number of Pins: 2; ESR (Equivalent Series Resistance): 180mR; ComponentLink3URL: http://nichicon-us.com/english/products/pdfs/e-ucl.pdf; ComponentLink3Description: http://nichicon-us.com/english/products/pdfs/e-ucl.pdf; Stock 3: 18022; Pricing 3: 1=0.77, 10=0.571, 100=0.3912, 500=0.30972 (USD); Contact Plating: Tin; Lead Pitch: 2.2mm; Radiation Hardening: No; ComponentLink4URL: http://www.farnell.com/datasheets/2059678.pdf; ComponentLink4Description: http://www.farnell.com/datasheets/2059678.pdf; ComponentLink5URL: http://uk.rs-online.com/webdocs/0df0/0900766b80df09a1.pdf; ComponentLink5Description: http://uk.rs-online.com/webdocs/0df0/0900766b80df09a1.pdf; ComponentLink6URL: http://www.farnell.com/datasheets/2244690.pdf; ComponentLink6Description: http://www.farnell.com/datasheets/2244690.pdf; ComponentLink7URL: https://www.alliedelec.com/m/d/f9a8f3530578bb19547681b1320b60ff.pdf; ComponentLink7Description: https://www.alliedelec.com/m/d/f9a8f3530578bb19547681b1320b60ff.pdf; ComponentLink8URL: http://industrial.panasonic.com/www-data/pdf/ABA0000/ABA0000CE114.pdf; ComponentLink8Description: http://industrial.panasonic.com/www-data/pdf/ABA0000/ABA0000CE114.pdf; ComponentLink9URL: https://www.distrelec.biz/Web/Downloads/_t/ds/fp_eng_tds.pdf?mime=application%2Fpdf; ComponentLink9Description: https://www.distrelec.biz/Web/Downloads/_t/ds/fp_eng_tds.pdf?mime=application%2Fpdf; Supplier 1: Digi-Key; Supplier Part Number 1: PCE3884DKR-ND
footprint C-E-8.3x8.3x10.2
pins: 1, 2
text: +

## CAE-330UF-RADIAL SMD
designator C?, comment 330UF  Voltage Rating: 35V  Case/Package: Radial
CAP ALUM 330UF 20% 35V SMD; Manufacturer: Panasonic; Manufacturer Part Number: EEE-1VA331P; Ripple Current (AC): 350mA; Polarity: Polar; Life (Hours): 2000Hour; Leakage Current: 3uA; Dissipation Factor: 0.3%; Lead Diameter: 0.9mm; Material: Aluminium; ESR (Equivalent Series Resistance): 150mR; Washability: OK; Stock 1: 26248; Pricing 1: 1=0.65, 10=0.482, 100=0.3304 (USD); Mount: PCB,Surface Mount; Contact Plating: Tin; Min Operating Temperature: -40°C; Max Operating Temperature: 85°C; Capacitance: 330uF; Packaging: Tape and Reel; Tolerance: 20%; Ripple Current: 350mA; Voltage Rating (DC): 35V; Package Quantity: 500; Termination: SMD/SMT; Voltage: 35V; Diameter: 10mm; Length: 10.5mm; Height: 10.2mm; Height - Seated (Max): 0.402inch; Radiation Hardening: No; REACH SVHC: No SVHC; Lead Free: Lead Free; ComponentLink1URL: http://industrial.panasonic.com/www-data/pdf/ABA0000/ABA0000CE2.pdf; ComponentLink1Description: http://industrial.panasonic.com/www-data/pdf/ABA0000/ABA0000CE2.pdf; ComponentLink2URL: http://www.farnell.com/datasheets/2245251.pdf; ComponentLink2Description: http://www.farnell.com/datasheets/2245251.pdf; ComponentLink3URL: https://www.alliedelec.com/m/d/310b2cfd0553a89b5ffae819c6e32d0a.pdf; ComponentLink3Description: https://www.alliedelec.com/m/d/310b2cfd0553a89b5ffae819c6e32d0a.pdf; ComponentLink4URL: http://www.mouser.com/ds/2/315/ABA0000C1145-947633.pdf; ComponentLink4Description: http://www.mouser.com/ds/2/315/ABA0000C1145-947633.pdf; ComponentLink5URL: http://www.industrial.panasonic.com/www-data/pdf/ABA0000/ABA0000CE2.pdf; ComponentLink5Description: http://www.industrial.panasonic.com/www-data/pdf/ABA0000/ABA0000CE2.pdf; ComponentLink6URL: http://www.farnell.com/datasheets/1909355.pdf; ComponentLink6Description: http://www.farnell.com/datasheets/1909355.pdf; Stock 2: 1224; Pricing 2: 1=0.74, 10=0.548, 100=0.3756 (USD); Lead Pitch: 4.6mm; ComponentLink7URL: http://www.farnell.com/datasheets/2059976.pdf; ComponentLink7Description: http://www.farnell.com/datasheets/2059976.pdf; ComponentLink8URL: http://industrial.panasonic.com/www-data/pdf/ABA0000/ABA0000CE115.pdf; ComponentLink8Description: http://industrial.panasonic.com/www-data/pdf/ABA0000/ABA0000CE115.pdf; Stock 3: 21574; Pricing 3: 1=0.8, 10=0.592, 100=0.4057 (USD); Impedance: 150mR; Width: 900um; ComponentLink9URL: http://uk.rs-online.com/webdocs/0e4a/0900766b80e4a876.pdf; ComponentLink9Description: http://uk.rs-online.com/webdocs/0e4a/0900766b80e4a876.pdf; ComponentLink10URL: http://industrial.panasonic.com/www-data/pdf/ABA0000/ABA0000CE5.pdf; ComponentLink10Description: http://industrial.panasonic.com/www-data/pdf/ABA0000/ABA0000CE5.pdf; ComponentLink11URL: https://www.alliedelec.com/m/d/5e395ce182861cdd9b9c36695bed6c89.pdf; ComponentLink11Description: https://www.alliedelec.com/m/d/5e395ce182861cdd9b9c36695bed6c89.pdf; ComponentLink12URL: https://www.alliedelec.com/m/d/ad9eed8922c31d260fc5efb233f3771b.pdf; ComponentLink12Description: https://www.alliedelec.com/m/d/ad9eed8922c31d260fc5efb233f3771b.pdf; Supplier 1: Digi-Key; Supplier Part Number 1: PCE3959DKR-ND
pins: 1, 2
text: +

## CAE-330UF-RADIAL-50V
designator C?, comment 330UF  Voltage Rating: 50V
CAP ALUM 330UF 20% 50V SMD; Manufacturer: Nichicon; Manufacturer Part Number: UCM1H331MNL1GS; Ripple Current: 900mA; Polarity: Polar; Impedance: 120mR; Life (Hours): 2000Hour; Supplier 1: Digi-Key; Supplier Part Number 1: 493-14535-1-ND; Stock: 3199; Pricing: 1=0.92, 10=0.701, 50=0.5824, 100=0.5015 (USD); RoHS: Yes; Mount: Surface Mount; Case/Package: SMD/SMT; Min Operating Temperature: -55°C; Max Operating Temperature: 105°C; Capacitance: 330uF; Voltage Rating (DC): 50V; Tolerance: 20%; Packaging: Tape and Reel; Package Quantity: 500; Termination: SMD/SMT; Voltage: 50V; Diameter: 10mm; Length: 10mm; Height: 10mm; Height - Seated (Max): 0.413inch; Lead Pitch: 4.5mm; Lead Free: Lead Free; ComponentLink1URL: http://www.mouser.com/ds/2/293/e-ucm-883824.pdf?src-supplier=Mouser; ComponentLink1Description: http://www.mouser.com/ds/2/293/e-ucm-883824.pdf?src-supplier=Mouser; ComponentLink2URL: http://uk.rs-online.com/webdocs/13bc/0900766b813bca52.pdf?src-supplier=RSComponents; ComponentLink2Description: http://uk.rs-online.com/webdocs/13bc/0900766b813bca52.pdf?src-supplier=RSComponents; ComponentLink3URL: http://nichicon-us.com/english/products/pdfs/e-ch_ta.pdf?src-supplier=Digi-Key; ComponentLink3Description: http://nichicon-us.com/english/products/pdfs/e-ch_ta.pdf?src-supplier=Digi-Key; ComponentLink4URL: http://nichicon-us.com/english/products/pdfs/e-ucm.pdf?src-supplier=Digi-Key; ComponentLink4Description: http://nichicon-us.com/english/products/pdfs/e-ucm.pdf?src-supplier=Digi-Key
footprint C-E-10.3x10.3x10.5
pins: 1, 2
text: +

## CAE-330UF-Radial-63V
designator C?, comment 330UF  Case/Package: Radial  Voltage Rating: 63V